# Altium footprint library mobinbyn-Module.PcbLib: 93 footprints (part 2 of 6)
Each footprint in its own frame and in the unit in brackets; x right, y up, seen from the top. Pads: shape width x height; smd on the part's side, far side on the other; paste and mask are expansions set on the pad; w line width, h text height; cw(c..) or ccw(c..) is an arc to the next point about the centre after c.
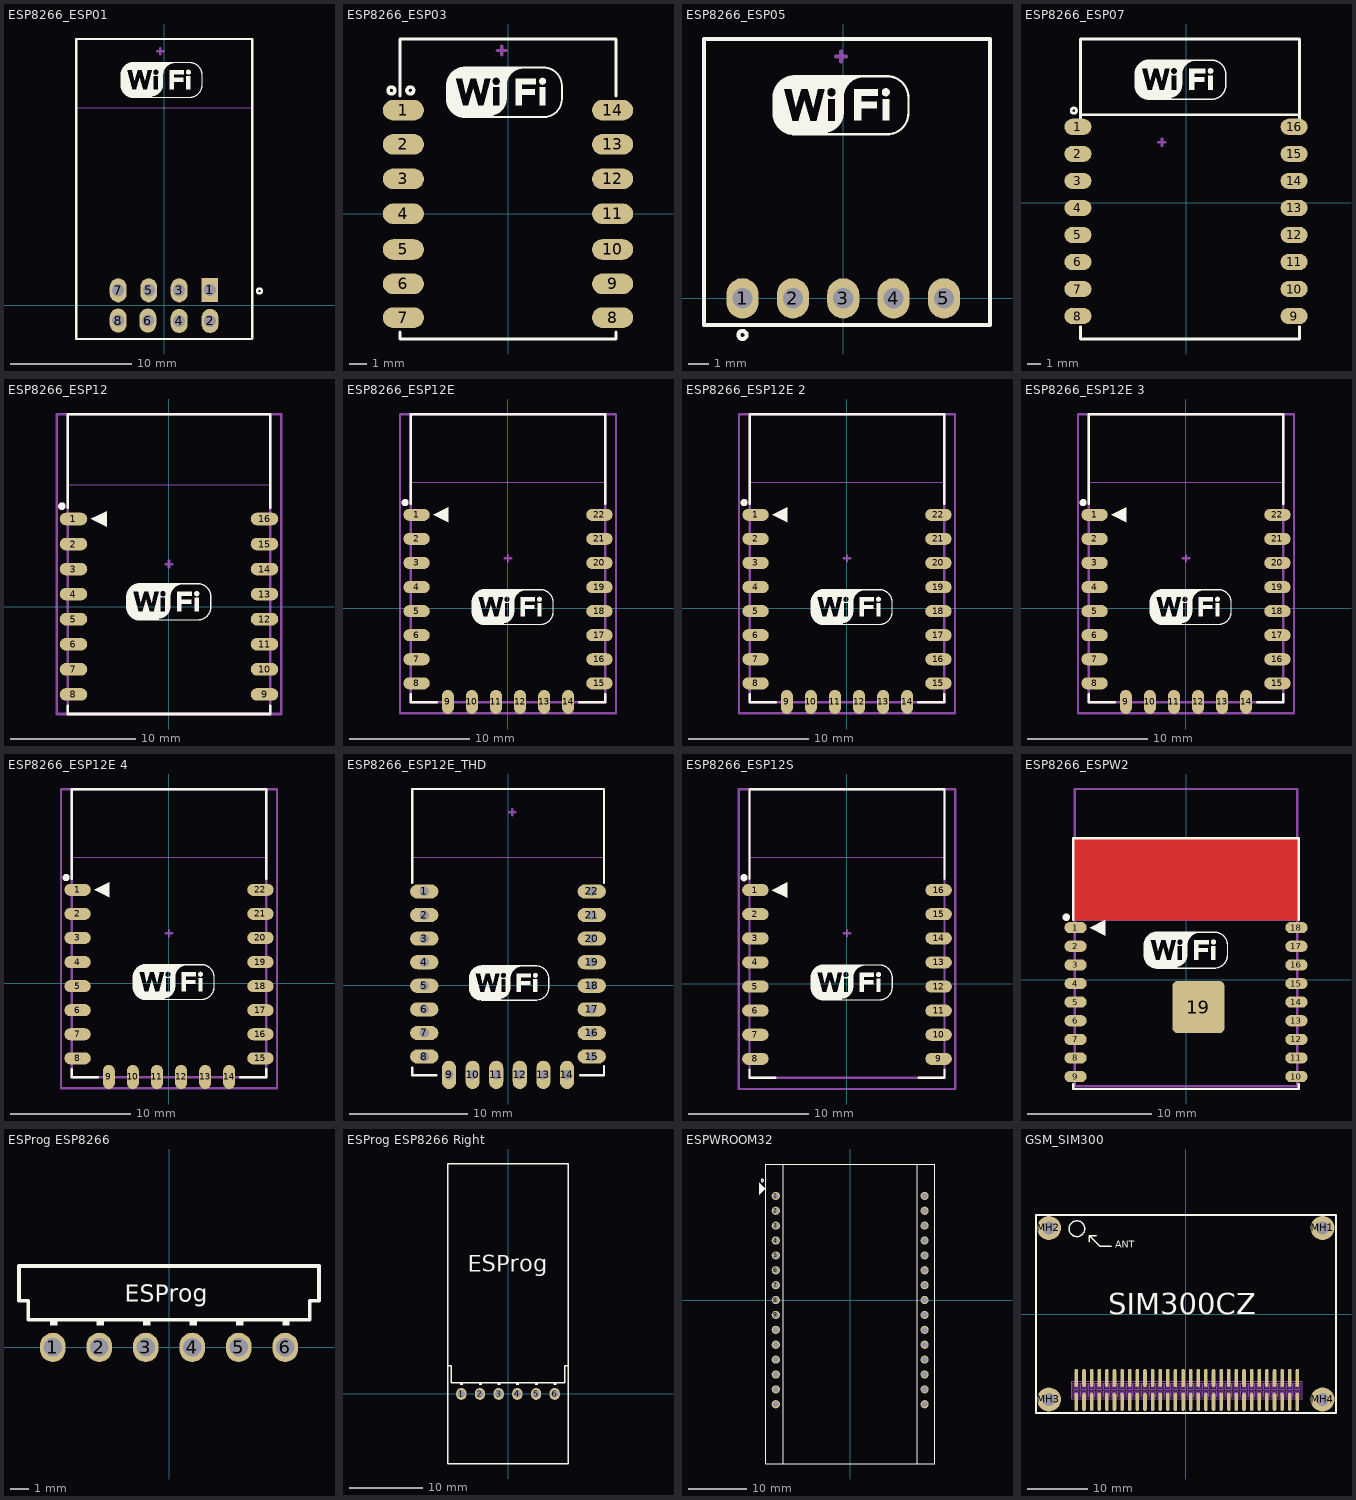
[diagram p1: the footprints below, top view; thin cyan lines are the x and y axes]

## ESP8266_ESP01 [mm] "ESP8266 ESP-01 Wi07C"
pads (8):
  rect 1.4x2 hole 1: 1(3.785,1.283)
  oval 1.4x2 hole 1: 2(3.81,-1.283) 3(1.245,1.257) 4(1.245,-1.283) 5(-1.27,1.257) 6(-1.346,-1.257) 7(-3.81,1.257) 8(-3.81,-1.257)
Top Overlay:
  drawing of 10 lines, arcs and shapes, not listed
Mechanical 13:
  lines w0.051: -7.289,16.395 7.315,16.395
Mechanical 15:
  lines w0.2: -0.559,21.067 -0.051,21.067 ; -0.305,20.813 -0.305,21.321
3D body "User Library-Wi07C.STEP": height 5.8, standoff -5.88, extent -7.261,-2.761 7.239,22.039

## ESP8266_ESP03 [mm] "ESP8266 ESP-03"
pads (14):
  oval 2.4x1.2 smd: 1(-6.1,6.051) 2(-6.1,4.051) 3(-6.1,2.038) 4(-6.1,0.006) 5(-6.1,-2.077) 6(-6.1,-4.084) 7(-6.1,-6.051) 8(6.1,-6.051) 9(6.1,-4.084) 10(6.1,-2.077) 11(6.1,0.006) 12(6.1,2.038) 13(6.1,4.051) 14(6.1,6.051)
Top Overlay:
  drawing of 12 lines, arcs and shapes, not listed
Mechanical 15:
  lines w0.2: -0.622,9.528 -0.114,9.528 ; -0.368,9.274 -0.368,9.782
3D body "User Library-ESP-03.STEP": height 3.42, standoff -0.02, extent -6.135,-7.183 6.165,10.117

## ESP8266_ESP05 [mm] "ESP8266 ESP-05"
pads (5):
  oval 1.6x2 hole 1: 1(-5,0) 2(-2.5,0) 3(0,0) 4(2.5,0) 5(5,0)
Top Overlay:
  drawing of 9 lines, arcs and shapes, not listed
Mechanical 15:
  lines w0.2: -0.359,12.012 0.149,12.012 ; -0.105,11.758 -0.105,12.266
3D body "PLS-1.step": height 7.32, standoff -4.12, extent -3.81,-1.27 -1.27,1.27
3D body "PLS-1.step": height 7.32, standoff -4.12, extent -6.35,-1.27 -3.81,1.27
3D body "PLS-1.step": height 7.32, standoff -4.12, extent -1.27,-1.27 1.27,1.27
3D body "PLS-1.step": height 7.32, standoff -4.12, extent 1.27,-1.27 3.81,1.27
3D body "PLS-1.step": height 7.32, standoff -4.12, extent 3.81,-1.27 6.35,1.27
3D body "User Library-esp8266-05.STEP": height 6.92, standoff 4.32, extent -7.25,-1.27 7.25,13.23

## ESP8266_ESP07 [mm] "ESP8266 ESP-07"
pads (16):
  oval 2x1.2 smd: 1(-8,5.6) 2(-8,3.6) 3(-8,1.6) 4(-8,-0.4) 5(-8,-2.4) 6(-8,-4.4) 7(-8,-6.4) 8(-8,-8.4) 9(8,-8.4) 10(8,-6.4) 11(8,-4.4) 12(8,-2.4) 13(8,-0.4) 14(8,1.6) 15(8,3.6) 16(8,5.6)
Top Overlay:
  drawing of 12 lines, arcs and shapes, not listed
Mechanical 15:
  lines w0.2: -2.034,4.456 -1.526,4.456 ; -1.78,4.202 -1.78,4.71
3D body "User Library-ESP07-1.step": height 3.5, standoff -0.01, extent -7.681,-9.987 8.319,12.013

## ESP8266_ESP12 [mm] "ESP8266 ESP-12 Wi-Fi Module"
height 3.2
pads (16):
  oval 2.2x1 smd: 1(-7.625,7) 2(-7.625,5) 3(-7.625,3) 4(-7.625,1) 5(-7.625,-1) 6(-7.625,-3) 7(-7.625,-5) 8(-7.625,-7) 9(7.625,-7) 10(7.625,-5) 11(7.625,-3) 12(7.625,-1) 13(7.625,1) 14(7.625,3) 15(7.625,5) 16(7.625,7)
Top Overlay:
  drawing of 12 lines, arcs and shapes, not listed
Mechanical 13:
  lines w0.051: -8.127,9.727 8.129,9.727 8.129,15.382 -8.127,15.382 -8.127,9.727
  lines w0.2: -8.084,-8.568 -8.084,15.371 8.084,15.371 8.084,-8.568 -8.084,-8.568
  text "ANTENNA AREA" at -7.873,14.874 h0.25
  text "CUTOUT POLYGON" at -7.873,14.366 h0.25
Mechanical 15:
  lines w0.2: -0.254,3.402 0.254,3.402 ; 0,3.148 0,3.656 ; -8.975,-8.568 8.975,-8.568 8.975,15.371 -8.975,15.371 -8.975,-8.568
3D body "ESP_12_ENew.STEP": height 3.82, standoff -0.05, extent -7.859,-8.522 8.156,15.509

## ESP8266_ESP12E [mm] "ESP-12 Wi-Fi Module"
height 3.2
pads (22):
  oval 2.2x1 smd: 1(-7.6,7.75) 2(-7.6,5.75) 3(-7.6,3.75) 4(-7.6,1.75) 5(-7.6,-0.25) 6(-7.6,-2.25) 7(-7.6,-4.25) 8(-7.6,-6.25) 15(7.6,-6.25) 16(7.6,-4.25) 17(7.6,-2.25) 18(7.6,-0.25) 19(7.6,1.75) 20(7.6,3.75) 21(7.6,5.75) 22(7.6,7.75)
  oval 1x2 smd: 9(-5,-7.8) 10(-3,-7.8) 11(-1,-7.8) 12(1,-7.8) 13(3,-7.8) 14(5,-7.8)
Top Overlay:
  drawing of 13 lines, arcs and shapes, not listed
Mechanical 13:
  lines w0.051: -8.127,10.477 -8.127,16.132 8.129,16.132 8.129,10.477 -8.127,10.477
  lines w0.2: -8.084,-7.818 8.084,-7.818 8.084,16.121 -8.084,16.121 -8.084,-7.818
Mechanical 15:
  lines w0.2: -0.254,4.152 0.254,4.152 ; 0,3.898 0,4.406 ; -8.975,-8.75 -8.975,16.121 8.975,16.121 8.975,-8.75 -8.975,-8.75
3D body "ESP_12_E.STEP": height 2.75, standoff 0.04, extent -7.999,-7.741 8.001,16.259

## ESP8266_ESP12E 2 [mm] "ESP-12 Wi-Fi Module"
height 3.2
pads (22):
  oval 2.2x1 smd: 1(-7.6,7.75) 2(-7.6,5.75) 3(-7.6,3.75) 4(-7.6,1.75) 5(-7.6,-0.25) 6(-7.6,-2.25) 7(-7.6,-4.25) 8(-7.6,-6.25) 15(7.6,-6.25) 16(7.6,-4.25) 17(7.6,-2.25) 18(7.6,-0.25) 19(7.6,1.75) 20(7.6,3.75) 21(7.6,5.75) 22(7.6,7.75)
  oval 1x2 smd: 9(-5,-7.8) 10(-3,-7.8) 11(-1,-7.8) 12(1,-7.8) 13(3,-7.8) 14(5,-7.8)
Top Overlay:
  drawing of 13 lines, arcs and shapes, not listed
Mechanical 13:
  lines w0.051: -8.127,10.477 8.129,10.477 8.129,16.132 -8.127,16.132 -8.127,10.477
  lines w0.2: -8.084,-7.818 -8.084,16.121 8.084,16.121 8.084,-7.818 -8.084,-7.818
Mechanical 15:
  lines w0.2: -0.254,4.152 0.254,4.152 ; 0,3.898 0,4.406 ; -8.975,-8.75 8.975,-8.75 8.975,16.121 -8.975,16.121 -8.975,-8.75
3D body "User Library-EPS8266 ESP-12E-1.step": height 2.65, standoff -0.04, extent -8.005,-7.687 8.005,16.318

## ESP8266_ESP12E 3 [mm] "ESP-12 Wi-Fi Module"
height 3.2
pads (22):
  oval 2.2x1 smd: 1(-7.6,7.75) 2(-7.6,5.75) 3(-7.6,3.75) 4(-7.6,1.75) 5(-7.6,-0.25) 6(-7.6,-2.25) 7(-7.6,-4.25) 8(-7.6,-6.25) 15(7.6,-6.25) 16(7.6,-4.25) 17(7.6,-2.25) 18(7.6,-0.25) 19(7.6,1.75) 20(7.6,3.75) 21(7.6,5.75) 22(7.6,7.75)
  oval 1x2 smd: 9(-5,-7.8) 10(-3,-7.8) 11(-1,-7.8) 12(1,-7.8) 13(3,-7.8) 14(5,-7.8)
Top Overlay:
  drawing of 13 lines, arcs and shapes, not listed
Mechanical 13:
  lines w0.051: -8.127,10.477 -8.127,16.132 8.129,16.132 8.129,10.477 -8.127,10.477
  lines w0.2: -8.084,-7.818 8.084,-7.818 8.084,16.121 -8.084,16.121 -8.084,-7.818
Mechanical 15:
  lines w0.2: -0.254,4.152 0.254,4.152 ; 0,3.898 0,4.406 ; -8.975,-8.75 -8.975,16.121 8.975,16.121 8.975,-8.75 -8.975,-8.75
3D body "User Library-ESP8266-12E.STEP": height 3.11, standoff 0.11, extent -8,-7.747 8,16.633

## ESP8266_ESP12E 4 [mm] "ESP-12 Wi-Fi Module"
height 3.2
pads (22):
  oval 2.2x1 smd: 1(-7.6,7.75) 2(-7.6,5.75) 3(-7.6,3.75) 4(-7.6,1.75) 5(-7.6,-0.25) 6(-7.6,-2.25) 7(-7.6,-4.25) 8(-7.6,-6.25) 15(7.6,-6.25) 16(7.6,-4.25) 17(7.6,-2.25) 18(7.6,-0.25) 19(7.6,1.75) 20(7.6,3.75) 21(7.6,5.75) 22(7.6,7.75)
  oval 1x2 smd: 9(-5,-7.8) 10(-3,-7.8) 11(-1,-7.8) 12(1,-7.8) 13(3,-7.8) 14(5,-7.8)
Top Overlay:
  drawing of 13 lines, arcs and shapes, not listed
Mechanical 13:
  lines w0.051: -8.127,10.477 8.129,10.477 8.129,16.132 -8.127,16.132 -8.127,10.477
  lines w0.2: -8.084,-7.818 -8.084,16.121 8.084,16.121 8.084,-7.818 -8.084,-7.818
Mechanical 15:
  lines w0.2: -0.254,4.152 0.254,4.152 ; 0,3.898 0,4.406 ; -8.975,-8.75 8.975,-8.75 8.975,16.121 -8.975,16.121 -8.975,-8.75
3D body "User Library-WIFI - ESP8266M0D.STEP": height 3.12, standoff -0.01, extent -8.182,-7.976 8.038,16.234

## ESP8266_ESP12E_THD [mm] "ESP8266 ESP-12-E YHD"
pads (22):
  oval 2.4x1.2 hole 0.8: 1(-7.1,7.95) 2(-7.1,5.95) 3(-7.1,3.95) 4(-7.1,1.95) 5(-7.1,-0.05) 6(-7.1,-2.05) 7(-7.1,-4.05) 8(-7.1,-6.05) 15(7.1,-6.05) 16(7.1,-4.05) 17(7.1,-2.05) 18(7.1,-0.05) 19(7.1,1.95) 20(7.1,3.95) 21(7.1,5.95) 22(7.1,7.95)
  oval 1.2x2.4 hole 0.8: 9(-5,-7.6) 10(-3,-7.6) 11(-1,-7.6) 12(1,-7.6) 13(3,-7.6) 14(5,-7.6)
Top Overlay:
  drawing of 11 lines, arcs and shapes, not listed
Mechanical 13:
  lines w0.051: -8.063,10.87 8.193,10.87
Mechanical 15:
  lines w0.2: 0.114,14.679 0.622,14.679 ; 0.368,14.425 0.368,14.933
3D body "User Library-ESP_12_E.STEP": height -0.34, standoff -2.55, extent -8.001,-7.493 7.999,16.507

## ESP8266_ESP12S [mm] "ESP-12 Wi-Fi Module"
height 3.2
pads (16):
  oval 2.2x1 smd: 1(-7.6,7.75) 2(-7.6,5.75) 3(-7.6,3.75) 4(-7.6,1.75) 5(-7.6,-0.25) 6(-7.6,-2.25) 7(-7.6,-4.25) 8(-7.6,-6.25) 9(7.6,-6.25) 10(7.6,-4.25) 11(7.6,-2.25) 12(7.6,-0.25) 13(7.6,1.75) 14(7.6,3.75) 15(7.6,5.75) 16(7.6,7.75)
Top Overlay:
  drawing of 13 lines, arcs and shapes, not listed
Mechanical 13:
  lines w0.051: -8.127,10.477 -8.127,16.132 8.129,16.132 8.129,10.477 -8.127,10.477
  lines w0.2: -8.084,-7.818 8.084,-7.818 8.084,16.121 -8.084,16.121 -8.084,-7.818
Mechanical 15:
  lines w0.2: -0.254,4.152 0.254,4.152 ; 0,3.898 0,4.406 ; -8.975,-8.75 -8.975,16.121 8.975,16.121 8.975,-8.75 -8.975,-8.75
3D body "User Library-esp-12s.step": height 3.24, standoff 0.11, extent -8.382,-7.682 7.618,16.318

## ESP8266_ESPW2 [mm] "ESP8266 ESP-WROOM-02 Wi-Fi Module"
height 3.2
pads (19):
  oval 1.8x0.9 smd: 1(-8.9,4.2) 2(-8.9,2.7) 3(-8.9,1.2) 4(-8.9,-0.3) 5(-8.9,-1.8) 6(-8.9,-3.3) 7(-8.9,-4.8) 8(-8.9,-6.3) 9(-8.9,-7.8) 10(8.9,-7.8) 11(8.9,-6.3) 12(8.9,-4.8) 13(8.9,-3.3) 14(8.9,-1.8) 15(8.9,-0.3) 16(8.9,1.2) 17(8.9,2.7) 18(8.9,4.2)
  rrect20% 4.2x4.2 smd: 19(1,-2.2)
Top Layer:
  pour cut-out: -9.1,4.8 -9.1,11.4 9.1,11.4 9.1,4.8
Bottom Layer:
  pour cut-out: -9.1,4.8 -9.1,11.4 9.1,11.4 9.1,4.8
Top Overlay:
  drawing of 12 lines, arcs and shapes, not listed
Mechanical 13:
  lines w0.051: -9,4.8 -9,11.382 9,11.382 9,4.8 -9,4.8
  text "CUTOUT POLYGON" at -7.873,10.366 h0.25
  text "ANTENNA AREA" at -7.873,10.874 h0.25
Mechanical 15:
  lines w0.2: -0.254,3.402 0.254,3.402 ; 0,3.148 0,3.656 ; -8.975,-8.568 -8.975,15.371 8.975,15.371 8.975,-8.568 -8.975,-8.568
3D body "User Library-ESP-WROOM-02.step": height 3, standoff 0, extent -9,-8.675 9,11.325

## ESProg ESP8266 [mm] "ESProg ESP8266"
pads (6):
  oval 1.4x1.6 / inner round 1.4 / far side oval 1.4x2.2 hole 1: 1(-6.35,0) 2(-3.81,0) 3(-1.27,0) 4(1.27,0) 5(3.81,0) 6(6.35,0)
Top Overlay:
  rectangle: -6.5,1.2 -6.1,1.5
  rectangle: -3.96,1.2 -3.56,1.5
  rectangle: -1.42,1.2 -1.02,1.5
  rectangle: 1.12,1.2 1.52,1.5
  rectangle: 3.66,1.2 4.06,1.5
  rectangle: 6.2,1.2 6.6,1.5
  lines w0.2: -8.2,2.54 -7.7,2.54 -7.7,1.5 7.7,1.5 7.7,2.54 8.2,2.54 8.2,4.445 -8.2,4.445 -8.2,2.54
  text "ESProg" at -2.413,2.159 h1.6
3D body "ESProg - ESP8266 & ESP32.STEP": height 37.35, standoff -3.33, extent -8,-4.145 8,4.445

## ESProg ESP8266 Right [mm] "ESProg ESP8266"
pads (6):
  oval 1.4x1.6 / inner round 1.4 / far side oval 1.4x2.2 hole 1: 1(-6.35,0) 2(-3.81,0) 3(-1.27,0) 4(1.27,0) 5(3.81,0) 6(6.35,0)
Top Overlay:
  rectangle: -6.5,1.2 -6.1,1.5
  rectangle: -3.96,1.2 -3.56,1.5
  rectangle: -1.42,1.2 -1.02,1.5
  rectangle: 1.12,1.2 1.52,1.5
  rectangle: 3.66,1.2 4.06,1.5
  rectangle: 6.2,1.2 6.6,1.5
  lines w0.2: -8.2,3.8 -8.2,-9.525 8.2,-9.525 8.2,3.8 ; -8.2,3.8 -7.7,3.8 -7.7,1.5 7.7,1.5 7.7,3.8 8.2,3.8 ; -8.2,3.8 -8.2,31.242 8.2,31.242 8.2,3.8
  text "ESProg" at -5.461,15.875 h3.81
3D body "ESProg - ESP8266 & ESP32.STEP": height 7.58, standoff -1.01, extent -7.999,-9.543 8.001,31.133

## ESPWROOM32 [mm] "ESP-WROOM-32"
pads (30):
  round 1.4 / inner round 1.4 / far side oval 2.2x1.4 hole 1: 1(-12.7,17.78) 2(-12.7,15.24) 3(-12.7,12.7) 4(-12.7,10.16) 5(-12.7,7.62) 6(-12.7,5.08) 7(-12.7,2.54) 8(-12.7,0) 9(-12.7,-2.54) 10(-12.7,-5.08) 11(-12.7,-7.62) 12(-12.7,-10.16) 13(-12.7,-12.7) 14(-12.7,-15.24) 15(-12.7,-17.78) 16(12.7,-17.78) 17(12.7,-15.24) 18(12.7,-12.7) 19(12.7,-10.16) 20(12.7,-7.62) 21(12.7,-5.08) 22(12.7,-2.54) 23(12.7,0) 24(12.7,2.54) 25(12.7,5.08) 26(12.7,7.62) 27(12.7,10.16) 28(12.7,12.7) 29(12.7,15.24) 30(12.7,17.78)
Top Overlay:
  circle w0.2: c-15,20.41 r0.2
  region: -14.5,18.98 -15.5,19.98 -15.5,17.98
  lines w0.2: -11.43,-27.98 -11.43,23.22 ; 11.43,-27.98 11.43,23.22 ; -14.4,-27.98 -14.4,23.22 14.4,23.22 14.4,-27.98 -14.4,-27.98
3D body "ESP-32_v1.STEP": height 15.9, standoff 3.5, extent -14.25,-27.82 14.25,23.11
3D body "PBD-2.stp": height 8.5, standoff -3.15, extent 11.43,-16.49 13.97,-11.41
3D body "PBD-2.stp": height 8.5, standoff -3.15, extent -13.97,-16.49 -11.43,-11.41
3D body "PBD-2.stp": height 8.5, standoff -3.15, extent -13.97,-11.41 -11.43,-6.33
3D body "PBD-2.stp": height 8.5, standoff -3.15, extent -13.97,-6.33 -11.43,-1.25
3D body "PBD-2.stp": height 8.5, standoff -3.15, extent -13.97,-1.25 -11.43,3.83
3D body "PBD-2.stp": height 8.5, standoff -3.15, extent -13.97,3.83 -11.43,8.91
3D body "PBD-2.stp": height 8.5, standoff -3.15, extent -13.97,8.91 -11.43,13.99
3D body "PBD-2.stp": height 8.5, standoff -3.15, extent -13.97,13.99 -11.43,19.07
3D body "PBS-1.stp": height 8.5, standoff -3.15, extent -13.97,-19.01 -11.43,-16.47
3D body "PBS-1.stp": height 8.5, standoff -3.15, extent 11.43,-19.01 13.97,-16.47
3D body "PBD-2.stp": height 8.5, standoff -3.15, extent 11.43,13.99 13.97,19.07
3D body "PBD-2.stp": height 8.5, standoff -3.15, extent 11.43,8.91 13.97,13.99
3D body "PBD-2.stp": height 8.5, standoff -3.15, extent 11.43,3.83 13.97,8.91
3D body "PBD-2.stp": height 8.5, standoff -3.15, extent 11.43,-1.25 13.97,3.83
3D body "PBD-2.stp": height 8.5, standoff -3.15, extent 11.43,-6.33 13.97,-1.25
3D body "PBD-2.stp": height 8.5, standoff -3.15, extent 11.43,-11.41 13.97,-6.33

## GSM_SIM300 [mm]
height 1.092
pads (64):
  oval 0.6x3 smd: 1(-18.224,-14.6) 2(-18.224,-10.6) 3(-16.954,-14.6) 4(-16.954,-10.6) 5(-15.684,-14.6) 6(-15.684,-10.6) 7(-14.414,-14.6) 8(-14.414,-10.6) 9(-13.144,-14.6) 10(-13.144,-10.6) 11(-11.874,-14.6) 12(-11.874,-10.6) 13(-10.604,-14.6) 14(-10.604,-10.6) 15(-9.335,-14.6) 16(-9.335,-10.6) 17(-8.064,-14.6) 18(-8.064,-10.6) 19(-6.794,-14.6) 20(-6.794,-10.6) 21(-5.524,-14.6) 22(-5.524,-10.6) 23(-4.255,-14.6) 24(-4.255,-10.6) 25(-2.984,-14.6) 26(-2.984,-10.6) 27(-1.714,-14.6) 28(-1.714,-10.6) 29(-0.445,-14.6) 30(-0.445,-10.6) 31(0.826,-14.6) 32(0.826,-10.6) 33(2.095,-14.6) 34(2.095,-10.6) 35(3.365,-14.6) 36(3.365,-10.6) 37(4.635,-14.6) 38(4.635,-10.6) 39(5.905,-14.6) 40(5.905,-10.6) 41(7.175,-14.6) 42(7.175,-10.6) 43(8.445,-14.6) 44(8.445,-10.6) 45(9.716,-14.6) 46(9.716,-10.6) 47(10.986,-14.6) 48(10.986,-10.6) 49(12.255,-14.6) 50(12.255,-10.6) 51(13.525,-14.6) 52(13.525,-10.6) 53(14.795,-14.6) 54(14.795,-10.6) 55(16.066,-14.6) 56(16.066,-10.6) 57(17.335,-14.6) 58(17.335,-10.6) 59(18.605,-14.6) 60(18.605,-10.6)
  round 4 hole 2.2: MH1(22.796,14.395) MH2(-22.796,14.395) MH3(-22.796,-14.18) MH4(22.796,-14.18)
Top Overlay:
  circle w0.254: c-18.135,14.268 r1.308
  lines w0.254: -16.066,12.109 -16.066,13.125 ; -14.922,13.125 -16.066,13.125 ; -12.383,11.347 -14.287,11.347 -16.066,13.125 ; -24.956,-16.446 25.045,-16.446 25.045,16.554 -24.956,16.554 -24.956,-16.446
  text "SIM300CZ" at -12.89,0.044 h3.56
  text "ANT" at -11.747,11.093 h1.14
Mechanical 1:
  drawing of 484 lines, arcs and shapes, not listed
  text "60" at 19.748,-9.862 h0.76
  text "59" at 19.748,-14.434 h0.76
  text "1" at -20.002,-15.45 h0.76
  text "2" at -20.002,-9.862 h0.76
3D body "User Library-SIM300C.step": height 8.79, standoff -3.05, extent -25.971,-16.488 26.509,16.635